# Altium footprint library lib_eps.PcbLib: 113 footprints (part 2 of 8)
Each footprint in its own frame and in the unit in brackets; x right, y up, seen from the top. Pads: shape width x height; smd on the part's side, far side on the other; paste and mask are expansions set on the pad; w line width, h text height; cw(c..) or ccw(c..) is an arc to the next point about the centre after c.
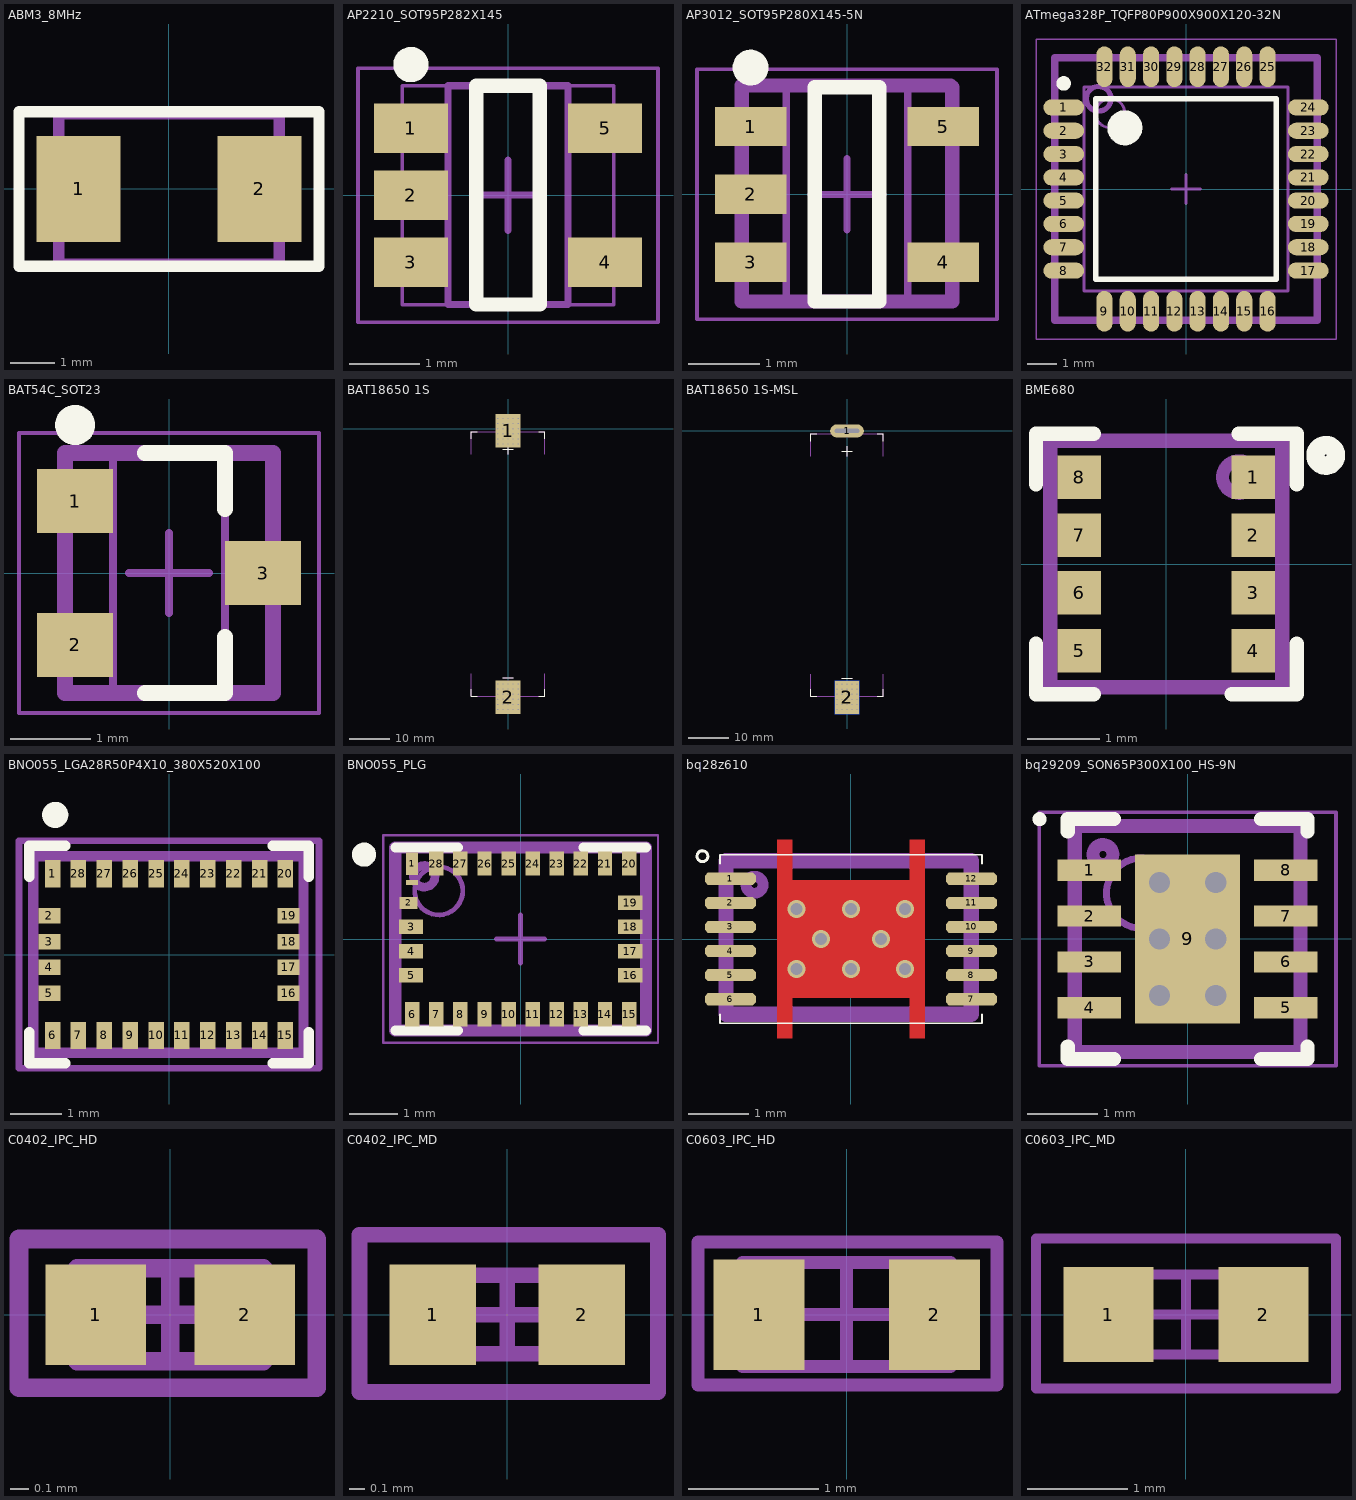
[diagram p1: the footprints below, top view; thin cyan lines are the x and y axes]

## ABM3_8MHz [mm] "CRYSTAL 8.0000MHZ 18PF SMD"
pads (2):
  rect 1.9x2.4 smd: 1(-2.05,0) 2(2.05,0)
Top Overlay:
  lines w0.254: -3.4,-1.75 -3.4,1.75 3.4,1.75 3.4,-1.75 -3.4,-1.75
Mechanical 29:
  lines w0.254: -2.5,-1.7 -2.5,1.3 -2.5,1.7 2.5,1.7 2.5,-1.7 -2.5,-1.7
  text "'.Designator'" at -1.9,-0.7 h1.52
3D body "ABM3.STEP": height 1.3, standoff 0, extent -2.5,-1.6 2.5,1.6

## AP2210_SOT95P282X145 [mm] "SOT23, 5-Leads, Body 2,96x2,82mm, Pitch 0,95mm, IPC Medium Density"
height 1.45
pads (5):
  rect 1.05x0.7 smd mask+0.051: 1(-1.375,0.95) 2(-1.375,0) 3(-1.375,-0.95) 4(1.375,-0.95) 5(1.375,0.95)
Top Overlay:
  circle w0.25: c-1.375,1.85 r0.125
  lines w0.2: -0.45,-1.55 -0.45,1.55 0.45,1.55 0.45,-1.55 -0.45,-1.55
Mechanical 13:
  lines w0.1: -0.85,-1.55 0.85,-1.55 0.85,1.55 -0.85,1.55 -0.85,-1.55
Mechanical 15:
  lines w0.05: -2.125,-1.8 2.125,-1.8 2.125,1.8 -2.125,1.8 -2.125,-1.8
  lines w0.1: -0.5,0 0.5,0 ; 0,-0.5 0,0.5
Mechanical 29:
  lines w0.05: -1.5,-1.425 -1.5,-1.55 ; -1.5,-1.55 1.5,-1.55 1.5,1.55 -1.5,1.55 -1.5,-1.55
  text "'.Designator'" at 0.1,-0.9 h0.6
3D body "AP2210_SOT95P282X145.step": height 1.45, standoff 0, extent -1.5,-1.55 1.5,1.55

## AP3012_SOT95P280X145-5N [mm] "SOT23, 5-Leads, Body 2,92x2,80mm, Pitch 0,95mm, IPC Medium Density"
height 1.45
pads (5):
  rect 1x0.55 smd: 1(-1.35,0.95) 2(-1.35,0) 3(-1.35,-0.95) 4(1.35,-0.95) 5(1.35,0.95)
Top Overlay:
  circle w0.25: c-1.35,1.775 r0.125
  lines w0.2: -0.45,-1.5 0.45,-1.5 0.45,1.5 -0.45,1.5 -0.45,-1.5
Mechanical 13:
  lines w0.1: -0.85,-1.51 -0.85,1.51 0.85,1.51 0.85,-1.51 -0.85,-1.51
Mechanical 15:
  lines w0.05: -2.1,-1.75 -2.1,1.75 2.1,1.75 2.1,-1.75 -2.1,-1.75
  lines w0.1: -0.5,0 0.5,0 ; 0,-0.5 0,0.5
Mechanical 29:
  lines w0.2: -1.475,-1.5 1.475,-1.5 1.475,1.5 1.45,1.525 -1.475,1.525 -1.475,-1.5
  text "'.Designator'" at -1.325,-0.475 h1
3D body "AP3012_SOT95P280X145-5N.step": height 1.45, standoff 0, extent -1.475,-1.51 1.475,1.51

## ATmega328P_TQFP80P900X900X120-32N [mm] "TQFP, 32-Leads, Body 7,00x7,00mm, Pitch 0,80mm, IPC Medium Density"
height 1.2
pads (32):
  oval 1.4x0.55 smd mask+0.051: 1(-4.2,2.8) 2(-4.2,2) 3(-4.2,1.2) 4(-4.2,0.4) 5(-4.2,-0.4) 6(-4.2,-1.2) 7(-4.2,-2) 8(-4.2,-2.8) 17(4.2,-2.8) 18(4.2,-2) 19(4.2,-1.2) 20(4.2,-0.4) 21(4.2,0.4) 22(4.2,1.2) 23(4.2,2) 24(4.2,2.8)
  oval 0.55x1.4 smd mask+0.051: 9(-2.8,-4.2) 10(-2,-4.2) 11(-1.2,-4.2) 12(-0.4,-4.2) 13(0.4,-4.2) 14(1.2,-4.2) 15(2,-4.2) 16(2.8,-4.2) 25(2.8,4.2) 26(2,4.2) 27(1.2,4.2) 28(0.4,4.2) 29(-0.4,4.2) 30(-1.2,4.2) 31(-2,4.2) 32(-2.8,4.2)
Top Overlay:
  circle w0.25: c-4.2,3.625 r0.125
  circle w0.6: c-2.1,2.1 r0.3
  lines w0.2: -3.1,-3.1 -3.1,3.1 3.1,3.1 3.1,-3.1 -3.1,-3.1
Mechanical 13:
  circle w0.1: c-2.6,2.6 r0.5
  lines w0.1: -3.5,-3.5 -3.5,3.5 3.5,3.5 3.5,-3.5 -3.5,-3.5
Mechanical 15:
  lines w0.05: -5.15,-5.15 -5.15,5.15 5.15,5.15 5.15,-5.15 -5.15,-5.15
  lines w0.1: -0.5,0 0.5,0 ; 0,-0.5 0,0.5
Mechanical 29:
  circle w0.18: c-3,3.1 r0.424
  lines w0.254: -4.5,-4.5 4.5,-4.5 4.5,4.5 -4.5,4.5 -4.5,-4.5
  text "'.Designator'" at -3.1,-0.6 h1.52
3D body "ATmega328P_TQFP80P900X900X120-32N.step": height 1.2, standoff 0, extent -4.5,-4.5 4.5,4.5

## BAT54C_SOT23 [mm] "SOT23, 3-Leads, Body 2,90x2,40mm, Pitch 0,90mm, IPC Medium Density"
height 1.1
pads (3):
  rect 0.95x0.8 smd: 1(-1.175,0.9) 2(-1.175,-0.9) 3(1.175,0)
Top Overlay:
  circle w0.25: c-1.175,1.85 r0.125
  lines w0.2: -0.3,-1.5 0.7,-1.5 0.7,-0.8 ; -0.3,1.5 0.7,1.5 0.7,0.8
Mechanical 13:
  lines w0.1: -0.7,-1.5 0.7,-1.5 0.7,1.5 -0.7,1.5 -0.7,-1.5
Mechanical 15:
  lines w0.05: -1.875,-1.75 1.875,-1.75 1.875,1.75 -1.875,1.75 -1.875,-1.75
  lines w0.1: -0.5,0 0.5,0 ; 0,-0.5 0,0.5
Mechanical 29:
  circle w0.18: c-0.9,1 r0.141
  lines w0.2: -1.3,-1.5 -1.3,1.5 1.3,1.5 1.3,-1.5 0.9,-1.5 -1.3,-1.5
  text "'.Designator'" at -1,-0.2 h0.6
3D body "SOT90P240X110-3N.step": height 1.1, standoff 0, extent -1.25,-1.5 1.25,1.5

## BAT18650 1S [mm]
pads (2):
  rect 6x8.2 smd: 1(0,-0.5) 2(0,-65.75)
via -2.5,-3.75 diameter 0.605 hole 0.3
via -2.5,-2.5 diameter 0.605 hole 0.3
via -2.5,-1.25 diameter 0.605 hole 0.3
via -2.5,0 diameter 0.605 hole 0.3
via -2.5,1.25 diameter 0.605 hole 0.3
via -2.5,2.5 diameter 0.605 hole 0.3
via 2.5,-3.75 diameter 0.605 hole 0.3
via 1.25,-3.75 diameter 0.605 hole 0.3
via 0,-3.75 diameter 0.605 hole 0.3
via -1.25,-3.75 diameter 0.605 hole 0.3
via 1.25,-2.5 diameter 0.605 hole 0.3
via 2.5,-2.5 diameter 0.605 hole 0.3
via 0,-2.5 diameter 0.605 hole 0.3
via -1.25,-2.5 diameter 0.605 hole 0.3
via 2.5,-1.25 diameter 0.605 hole 0.3
via 1.25,-1.25 diameter 0.605 hole 0.3
via 0,-1.25 diameter 0.605 hole 0.3
via -1.25,-1.25 diameter 0.605 hole 0.3
via 2.5,0 diameter 0.605 hole 0.3
via 1.25,0 diameter 0.605 hole 0.3
via 0,0 diameter 0.605 hole 0.3
via -1.25,0 diameter 0.605 hole 0.3
via 2.5,1.25 diameter 0.605 hole 0.3
via 1.25,1.25 diameter 0.605 hole 0.3
via 0,1.25 diameter 0.605 hole 0.3
via -1.25,1.25 diameter 0.605 hole 0.3
via 0,2.5 diameter 0.605 hole 0.3
via 1.25,2.5 diameter 0.605 hole 0.3
via 2.5,2.5 diameter 0.605 hole 0.3
via -1.25,2.5 diameter 0.605 hole 0.3
via -2.5,-63.75 diameter 0.605 hole 0.3
via -2.5,-62.5 diameter 0.605 hole 0.3
via -1.25,-62.5 diameter 0.605 hole 0.3
via 0,-62.5 diameter 0.605 hole 0.3
via 1.25,-62.5 diameter 0.605 hole 0.3
via 2.5,-62.5 diameter 0.605 hole 0.3
via -1.25,-63.75 diameter 0.605 hole 0.3
via 0,-63.75 diameter 0.605 hole 0.3
via 1.25,-63.75 diameter 0.605 hole 0.3
via 2.5,-63.75 diameter 0.605 hole 0.3
via -2.5,-65 diameter 0.605 hole 0.3
via -1.25,-65 diameter 0.605 hole 0.3
via 0,-65 diameter 0.605 hole 0.3
via 1.25,-65 diameter 0.605 hole 0.3
via 2.5,-65 diameter 0.605 hole 0.3
via -2.5,-66.25 diameter 0.605 hole 0.3
via -1.25,-66.25 diameter 0.605 hole 0.3
via 0,-66.25 diameter 0.605 hole 0.3
via 1.25,-66.25 diameter 0.605 hole 0.3
via 2.5,-66.25 diameter 0.605 hole 0.3
via -2.5,-67.5 diameter 0.605 hole 0.3
via -1.25,-67.5 diameter 0.605 hole 0.3
via 0,-67.5 diameter 0.605 hole 0.3
via 1.25,-67.5 diameter 0.605 hole 0.3
via 2.5,-67.5 diameter 0.605 hole 0.3
via -2.5,-68.75 diameter 0.605 hole 0.3
via -1.25,-68.75 diameter 0.605 hole 0.3
via 0,-68.75 diameter 0.605 hole 0.3
via 1.25,-68.75 diameter 0.605 hole 0.3
via 2.5,-68.75 diameter 0.605 hole 0.3
Top Overlay:
  lines w0.25: -9,-63.75 -9,-64.25 -9,-65.5 -7.5,-65.5 ; -9,-2.5 -9,-0.75 -7.5,-0.75 ; -1.25,-61 1.25,-61 ; -1.25,-5 1.25,-5 ; 0,-6.25 0,-5 0,-3.75 ; 7.5,-65.5 9,-65.5 9,-63.75 ; 7.5,-0.75 9,-0.75 9,-2.5
Mechanical 29:
  lines w0.2: -1.3,-61 1.3,-61 ; -1.2,-5 1.2,-5 ; 0,-6.2 0,-3.8
  lines w0.254: -9,-60 -9,-65.5 9,-65.5 9,-60 ; -9,-6.25 -9,-0.75 9,-0.75 9,-6.25
  text "'.Designator'" at 0,-37.5 h1.52
3D body "18650_bp4-4_smd.stp": height 18.82, standoff 0.02, extent -9.009,-69.7 8.991,3.45

## BAT18650 1S-MSL [mm]
pads (3):
  oval 8.35x3.15 hole 1 slot 6 at 0 deg: 1(0,0)
  rect 6x8.2 smd: 2(0,-65.75)
  rect 6x8.2 smd far side: 2(0,-65.75)
via 2.5,-68.75 diameter 0.605 hole 0.3
via 1.25,-68.75 diameter 0.605 hole 0.3
via 0,-68.75 diameter 0.605 hole 0.3
via -1.25,-68.75 diameter 0.605 hole 0.3
via -2.5,-68.75 diameter 0.605 hole 0.3
via 2.5,-67.5 diameter 0.605 hole 0.3
via 1.25,-67.5 diameter 0.605 hole 0.3
via 0,-67.5 diameter 0.605 hole 0.3
via -1.25,-67.5 diameter 0.605 hole 0.3
via -2.5,-67.5 diameter 0.605 hole 0.3
via 2.5,-66.25 diameter 0.605 hole 0.3
via 1.25,-66.25 diameter 0.605 hole 0.3
via 0,-66.25 diameter 0.605 hole 0.3
via -1.25,-66.25 diameter 0.605 hole 0.3
via -2.5,-66.25 diameter 0.605 hole 0.3
via 2.5,-65 diameter 0.605 hole 0.3
via 1.25,-65 diameter 0.605 hole 0.3
via 0,-65 diameter 0.605 hole 0.3
via -1.25,-65 diameter 0.605 hole 0.3
via -2.5,-65 diameter 0.605 hole 0.3
via 2.5,-63.75 diameter 0.605 hole 0.3
via 1.25,-63.75 diameter 0.605 hole 0.3
via 0,-63.75 diameter 0.605 hole 0.3
via -1.25,-63.75 diameter 0.605 hole 0.3
via 2.5,-62.5 diameter 0.605 hole 0.3
via 1.25,-62.5 diameter 0.605 hole 0.3
via 0,-62.5 diameter 0.605 hole 0.3
via -1.25,-62.5 diameter 0.605 hole 0.3
via -2.5,-62.5 diameter 0.605 hole 0.3
via -2.5,-63.75 diameter 0.605 hole 0.3
Top Overlay:
  lines w0.25: -9,-63.75 -9,-64.25 -9,-65.5 -7.5,-65.5 ; -9,-2.5 -9,-0.75 -7.5,-0.75 ; -1.25,-61 1.25,-61 ; -1.25,-5 1.25,-5 ; 0,-6.25 0,-5 0,-3.75 ; 7.5,-65.5 9,-65.5 9,-63.75 ; 7.5,-0.75 9,-0.75 9,-2.5
Mechanical 29:
  lines w0.2: -1.3,-61 1.3,-61 ; -1.2,-5 1.2,-5 ; 0,-6.2 0,-3.8
  lines w0.254: -9,-60 -9,-65.5 9,-65.5 9,-60 ; -9,-6.25 -9,-0.75 9,-0.75 9,-6.25
  text "'.Designator'" at 0,-37.5 h1.52
3D body "18650_bp4-4MSL.stp": height 18.8, standoff -4.85, extent -9,-68.95 9,0

## BME680 [mm] "SENSOR RH PRESSURE TEMP VOC"
pads (8):
  rect 0.6x0.6 smd: 1(1.2,1.2) 2(1.2,0.4) 3(1.2,-0.4) 4(1.2,-1.2) 5(-1.2,-1.2) 6(-1.2,-0.4) 7(-1.2,0.4) 8(-1.2,1.2)
Top Overlay:
  circle w0.254: c2.2,1.5 r0.141
  lines w0.2: -1.8,-1.1 -1.8,-1.8 -1,-1.8 ; -1.8,1.1 -1.8,1.8 -1,1.8 ; 0.9,-1.8 1.8,-1.8 1.8,-1.1 ; 1,1.8 1.8,1.8 1.8,1.1
Mechanical 29:
  circle w0.18: c1,1.2 r0.224
  lines w0.2: -1.6,-1.7 -1.6,1.7 -0.2,1.7 1.6,1.7 1.6,-1.7 -1.6,-1.7
  text "'.Designator'" at -1.1,-0.2 h0.6
3D body "Bosch bme680.step": height 0.8, standoff -0.13, extent -1.5,-1.5 1.5,1.5

## BNO055_LGA28R50P4X10_380X520X100 [mm]
pads (28):
  rect 0.3x0.525 smd: 1(-2.25,1.562) 6(-2.25,-1.562) 7(-1.75,-1.562) 8(-1.25,-1.562) 9(-0.75,-1.562) 10(-0.25,-1.562) 11(0.25,-1.562) 12(0.75,-1.562) 13(1.25,-1.562) 14(1.75,-1.562) 15(2.25,-1.562) 20(2.25,1.562) 21(1.75,1.562) 22(1.25,1.562) 23(0.75,1.562) 24(0.25,1.562) 25(-0.25,1.562) 26(-0.75,1.562) 27(-1.25,1.562) 28(-1.75,1.562)
  rect 0.425x0.3 smd: 2(-2.312,0.75) 3(-2.312,0.25) 4(-2.312,-0.25) 5(-2.312,-0.75) 16(2.312,-0.75) 17(2.312,-0.25) 18(2.312,0.25) 19(2.312,0.75)
Top Overlay:
  circle w0.305: c-2.2,2.7 r0.1
  lines w0.2: -2.7,-1.5 -2.7,-2.1 -2,-2.1 ; -2.7,1.5 -2.7,2.1 -2,2.1 ; 2,-2.1 2.7,-2.1 2.7,-1.5 ; 2,2.1 2.7,2.1 2.7,1.5
Mechanical 16:
  lines w0.127: -2.9,-2.2 2.9,-2.2 2.9,2.2 -2.9,2.2 -2.9,-2.2
Mechanical 29:
  lines w0.2: -2.625,-1.9 2.6,-1.9 2.6,1.9 -2.625,1.9 -2.625,-1.9
  text "'.Designator'" at -2.175,-0.425 h0.96
3D body "BNO055-0273141209.SLDPRT": height 1.1, standoff -0.03, extent -2.6,-1.9 2.6,1.9

## BNO055_PLG [mm] "PQFN, 28-Leads, Body 5,20x3,80mm, Pitch 0,50mm, IPC Medium Density"
height 1
pads (29):
  rect 0.25x0.1 smd: 0(-2.25,1.175)
  rect 0.25x0.475 smd: 1(-2.25,1.562)
  rect 0.375x0.25 smd: 2(-2.325,0.75)
  rect 0.5x0.3 smd: 3(-2.275,0.25) 4(-2.275,-0.25) 5(-2.275,-0.75) 16(2.275,-0.75) 17(2.275,-0.25) 18(2.275,0.25) 19(2.275,0.75)
  rect 0.3x0.5 smd: 6(-2.25,-1.562) 7(-1.75,-1.562) 8(-1.25,-1.562) 9(-0.75,-1.562) 10(-0.25,-1.562) 11(0.25,-1.562) 12(0.75,-1.562) 13(1.25,-1.562) 14(1.75,-1.562) 15(2.25,-1.562) 20(2.25,1.562) 21(1.75,1.562) 22(1.25,1.562) 23(0.75,1.562) 24(0.25,1.562) 25(-0.25,1.562) 26(-0.75,1.562) 27(-1.25,1.562) 28(-1.75,1.562)
Top Overlay:
  circle w0.25: c-3.25,1.75 r0.125
  lines w0.2: -2.6,-1.9 -1.3,-1.9 ; -2.6,1.9 -1.3,1.9 ; 1.3,-1.9 2.6,-1.9 ; 1.3,1.9 2.6,1.9
Mechanical 13:
  circle w0.1: c-1.7,1 r0.5
  lines w0.1: -2.6,-1.9 2.6,-1.9 2.6,1.9 -2.6,1.9 -2.6,-1.9
Mechanical 15:
  lines w0.05: -2.85,-2.15 2.85,-2.15 2.85,2.15 -2.85,2.15 -2.85,-2.15
  lines w0.1: -0.5,0 0.5,0 ; 0,-0.5 0,0.5
Mechanical 29:
  circle w0.18: c-2,1.3 r0.224
  lines w0.254: -2.6,-1.9 -2.6,1.8 -2.6,1.9 2.6,1.9 2.6,-1.9 -2.6,-1.9
  text "'.Designator'" at -0.6,-0.4 h0.6
3D body "BNO055-0273141209.SLDPRT": height 1, standoff -0.13, extent -2.6,-1.9 2.6,1.9

## bq28z610 [mm]
pads (12):
  oct 0.85x0.2 smd: 1(-2,1) 2(-2,0.6) 3(-2,0.2) 4(-2,-0.2) 5(-2,-0.6) 6(-2,-1) 7(2,-1) 8(2,-0.6) 9(2,-0.2) 10(2,0.2) 11(2,0.6) 12(2,1)
via 0,0.5 diameter 0.3 hole 0.2
via 0,-0.5 diameter 0.3 hole 0.2
via 0.9,0.5 diameter 0.3 hole 0.2
via 0.9,-0.5 diameter 0.3 hole 0.2
via -0.9,-0.5 diameter 0.3 hole 0.2
via -0.9,0.5 diameter 0.3 hole 0.2
via -0.5,0 diameter 0.3 hole 0.2
via 0.5,0 diameter 0.3 hole 0.2
Top Layer:
  region: -0.975,0.975 0.975,0.975 0.975,1.65 1.225,1.65 1.225,-1.65 0.975,-1.65 0.975,-0.975 -0.975,-0.975 -0.975,-1.65 -1.225,-1.65 -1.225,1.65 -0.975,1.65
Top Overlay:
  lines w0.03: -2.175,-1.25 -2.175,-1.4 2.175,-1.4 2.175,-1.25 ; -2.175,1.25 -2.175,1.4 2.175,1.4 2.175,1.25
  lines w0.05: -2.378,1.397 ccw(c-2.465,1.375) -2.375,1.375
Mechanical 29:
  circle w0.18: c-1.6,0.9 r0.141
  lines w0.254: -2.075,-1.25 -2.075,1.3 2,1.3 2,-1.25 -2.075,-1.25
  text "'.Designator'" at -0.9,-0.3 h0.6
3D body: height 0.9, standoff 0.02, extent -2.075,-1.3 2.075,1.3

## bq29209_SON65P300X100_HS-9N [mm] "SON, 8-Leads, Body 3,00x3,00mm, Pitch 0,65mm, Thermal Pad 2,40x1,49mm, IPC Medium Density"
height 1
pads (9):
  rect 0.9x0.3 smd mask+0.051: 1(-1.395,0.975) 2(-1.395,0.325) 3(-1.395,-0.325) 4(-1.395,-0.975) 5(1.395,-0.975) 6(1.395,-0.325) 7(1.395,0.325) 8(1.395,0.975)
  rect 1.49x2.4 smd mask+0.051: 9(0,0)
via -0.4,0 diameter 0.605 hole 0.3
via -0.4,0.8 diameter 0.605 hole 0.3
via 0.4,0.8 diameter 0.605 hole 0.3
via 0.4,0 diameter 0.605 hole 0.3
via -0.4,-0.8 diameter 0.605 hole 0.3
via 0.4,-0.8 diameter 0.605 hole 0.3
Top Overlay:
  circle w0.1: c-2.1,1.7 r0.05
  lines w0.2: -1.7,-1.525 -1.7,-1.7 -1.045,-1.7 ; -1.7,1.525 -1.7,1.7 -1.045,1.7 ; 1.045,-1.7 1.7,-1.7 1.7,-1.525 ; 1.045,1.7 1.7,1.7 1.7,1.525
Mechanical 13:
  circle w0.1: c-0.65,0.65 r0.5
  lines w0.1: -1.55,-1.55 -1.55,1.55 1.55,1.55 1.55,-1.55 -1.55,-1.55
Mechanical 15:
  lines w0.05: -2.105,-1.8 -2.105,1.8 2.105,1.8 2.105,-1.8 -2.105,-1.8
  lines w0.1: -0.5,0 0.5,0 ; 0,-0.5 0,0.5
Mechanical 29:
  circle w0.18: c-1.2,1.2 r0.141
  lines w0.2: -1.6,-1.6 -1.6,1.6 1.6,1.6 1.6,-1.6 -1.6,-1.6
  text "'.Designator'" at -1.3,-0.25 h0.6
3D body "bq29209_SON65P300X100_HS-9N.step": height 1, standoff 0, extent -1.6,-1.55 1.6,1.55

## C0402_IPC_HD [mm] "Chip Capacitor, 2-Leads, Body 1,00x0,50mm, IPC High Density"
height 0.5
pads (2):
  rect 0.54x0.54 smd: 1(-0.4,0) 2(0.4,0)
Mechanical 13:
  lines w0.1: -0.5,-0.25 0.5,-0.25 0.5,0.25 -0.5,0.25 -0.5,-0.25
Mechanical 15:
  lines w0.05: -0.8,-0.4 0.8,-0.4 0.8,0.4 -0.8,0.4 -0.8,-0.4
  lines w0.1: -0.25,0 0.25,0 ; 0,-0.25 0,0.25
Mechanical 29:
  lines w0.1: -0.813,-0.394 -0.813,0.406 0.787,0.406 0.787,-0.394 -0.813,-0.394
  text ".Designator" at -0.66,-0.152 h0.36
3D body "C0402_IPC_HD.step": height 0.5, standoff 0, extent -0.5,-0.25 0.5,0.25

## C0402_IPC_MD [mm] "Chip Capacitor, 2-Leads, Body 1,00x0,50mm, IPC Medium Density"
height 0.5
pads (2):
  rect 0.55x0.64 smd: 1(-0.475,0) 2(0.475,0)
Mechanical 13:
  lines w0.1: -0.5,-0.25 -0.5,0.25 0.5,0.25 0.5,-0.25 -0.5,-0.25
Mechanical 15:
  lines w0.05: -0.95,-0.5 -0.95,0.5 0.95,0.5 0.95,-0.5 -0.95,-0.5
  lines w0.1: -0.25,0 0.25,0 ; 0,-0.25 0,0.25
Mechanical 29:
  lines w0.1: -0.94,-0.492 0.96,-0.492 0.96,0.508 -0.94,0.508 -0.94,-0.492
  text ".Designator" at -0.8,-0.1 h0.36
3D body "C0402_IPC_MD.step": height 0.5, standoff 0, extent -0.5,-0.25 0.5,0.25

## C0603_IPC_HD [mm] "Chip Capacitor, 2-Leads, Body 1,60x0,80mm, IPC High Density"
height 0.8
pads (2):
  rect 0.7x0.85 smd: 1(-0.675,0) 2(0.675,0)
Mechanical 13:
  lines w0.1: -0.8,-0.4 0.8,-0.4 0.8,0.4 -0.8,0.4 -0.8,-0.4
Mechanical 15:
  lines w0.05: -1.15,-0.55 1.15,-0.55 1.15,0.55 -1.15,0.55 -1.15,-0.55
  lines w0.1: -0.4,0 0.4,0 ; 0,-0.4 0,0.4
Mechanical 29:
  lines w0.1: -1.143,-0.541 -1.143,0.559 1.157,0.559 1.157,-0.541 -1.143,-0.541
  text ".Designator" at -0.965,-0.203 h0.5
3D body "C0603_IPC_HD.step": height 0.8, standoff 0, extent -0.8,-0.4 0.8,0.4

## C0603_IPC_MD [mm] "Chip Capacitor, 2-Leads, Body 1,60x0,80mm, IPC Medium Density"
height 0.8
pads (2):
  rect 0.9x0.95 smd: 1(-0.775,0) 2(0.775,0)
Mechanical 13:
  lines w0.1: -0.8,-0.4 0.8,-0.4 0.8,0.4 -0.8,0.4 -0.8,-0.4
Mechanical 15:
  lines w0.05: -1.5,-0.75 1.5,-0.75 1.5,0.75 -1.5,0.75 -1.5,-0.75
  lines w0.1: -0.4,0 0.4,0 ; 0,-0.4 0,0.4
Mechanical 29:
  lines w0.1: -1.499,-0.738 -1.499,0.762 1.501,0.762 1.501,-0.738 -1.499,-0.738
  text ".Designator" at -1.295,-0.229 h0.6
3D body "C0603_IPC_MD.step": height 0.8, standoff 0, extent -0.8,-0.4 0.8,0.4